# Altium footprint library 22-Transformer.PcbLib: 68 footprints (part 3 of 5)
Each footprint in its own frame and in the unit in brackets; x right, y up, seen from the top. Pads: shape width x height; smd on the part's side, far side on the other; paste and mask are expansions set on the pad; w line width, h text height; cw(c..) or ccw(c..) is an arc to the next point about the centre after c.
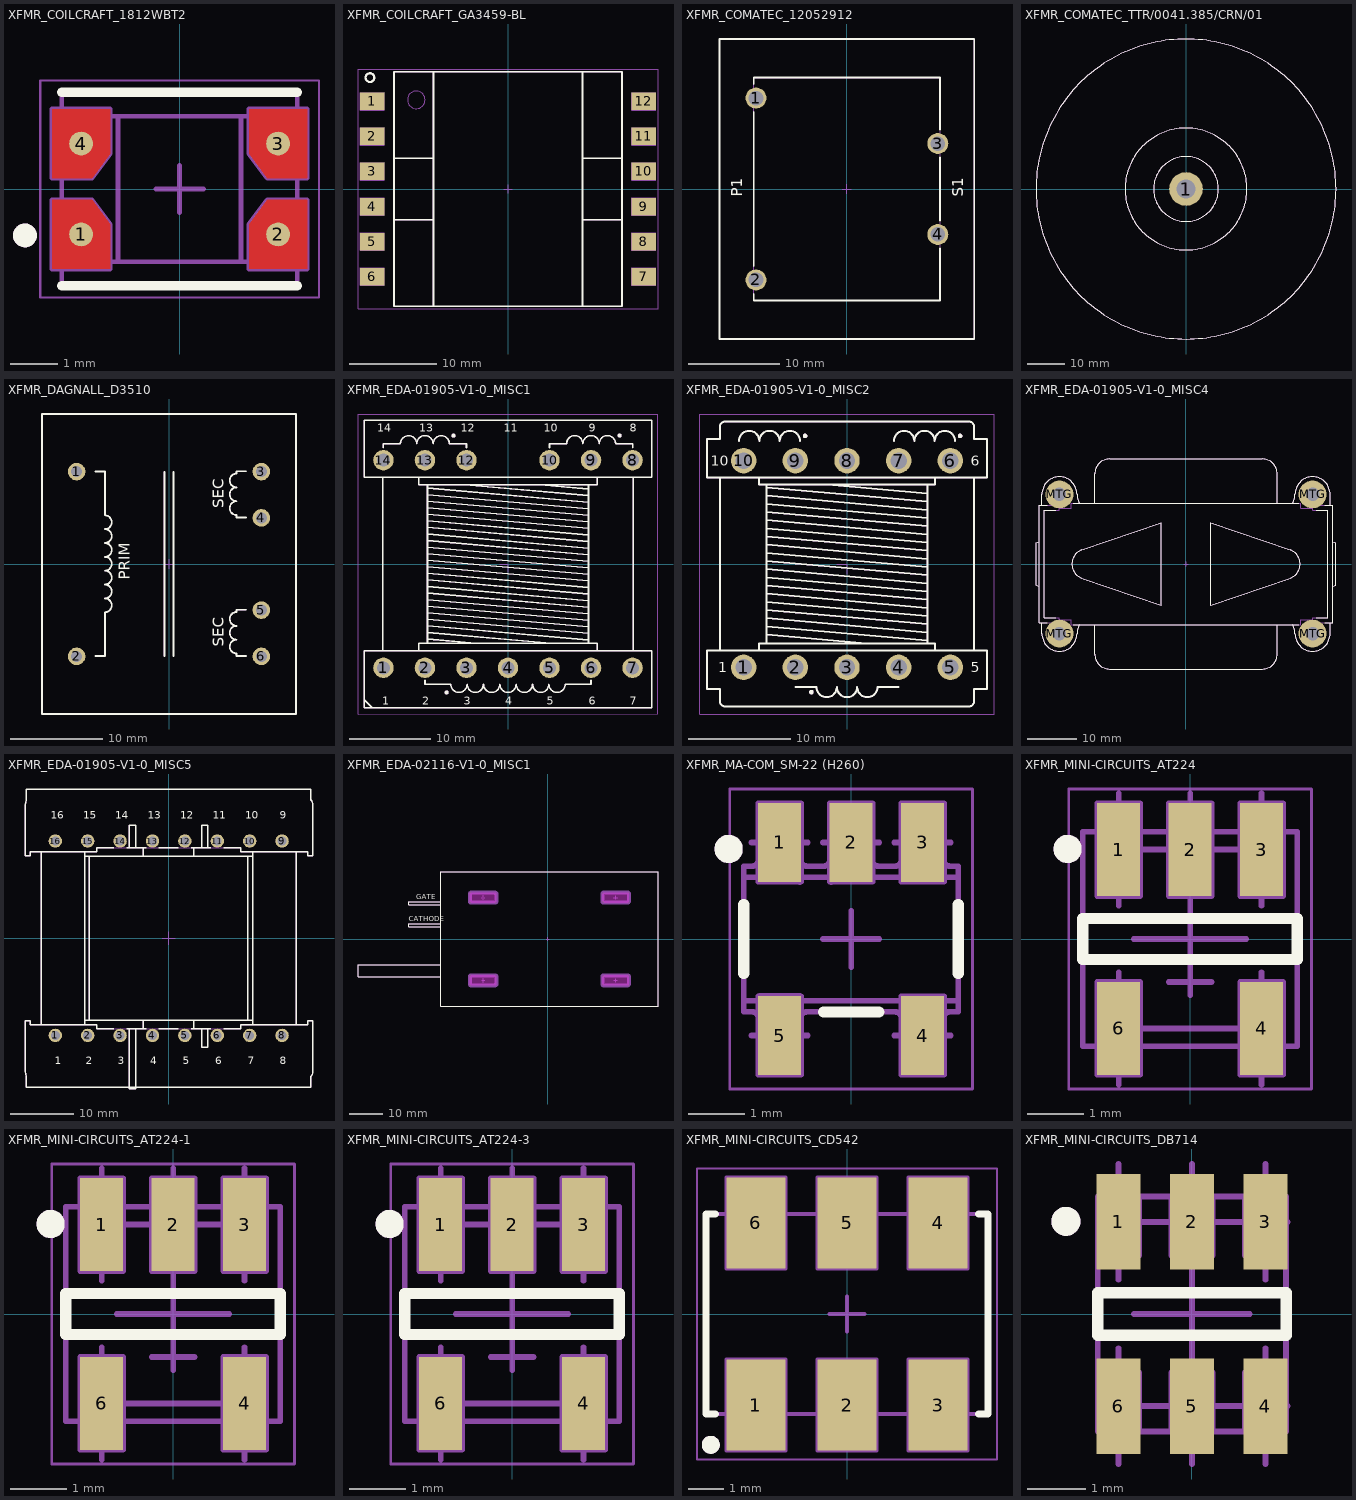
[diagram p2: the footprints below, top view; thin cyan lines are the x and y axes]

## XFMR_COILCRAFT_1812WBT2 [mm] "Surface Mount Wideband RF Transformer, Body 4.95 x 3.81mm"
height 3.43
pads (4):
  round 0.5 smd paste-0.26 mask-0.26: 1(-2.07,-0.955) 2(2.07,-0.955) 3(2.07,0.955) 4(-2.07,0.955)
Top Layer:
  region: -2.68,1.68 -1.46,1.68 -1.46,0.74 -1.84,0.23 -2.68,0.23
  region: -2.68,-1.68 -1.46,-1.68 -1.46,-0.74 -1.84,-0.23 -2.68,-0.23
  region: 2.68,-1.68 1.46,-1.68 1.46,-0.74 1.84,-0.23 2.68,-0.23
  region: 2.68,1.68 1.46,1.68 1.46,0.74 1.84,0.23 2.68,0.23
Top Overlay:
  circle w0.25: c-3.25,-0.975 r0.125
  lines w0.2: -2.475,-2.03 2.475,-2.03 ; -2.475,2.03 2.475,2.03
Mechanical 8:
  lines w0.1: -2.57,-0.955 -2.07,-0.955 ; -2.57,0.955 -2.07,0.955 ; -2.07,-1.455 -2.07,-0.955 ; -2.07,-0.455 -2.07,-0.955 ; -2.07,0.455 -2.07,0.955 ; -2.07,1.455 -2.07,0.955 ; -1.57,-0.955 -2.07,-0.955 ; -1.57,0.955 -2.07,0.955 ; -0.5,0 0,0 ; 0,-0.5 0,0 ; 0,0.5 0,0 ; 0.5,0 0,0 ; 1.57,-0.955 2.07,-0.955 ; 1.57,0.955 2.07,0.955 ; 2.07,-1.455 2.07,-0.955 ; 2.07,-0.455 2.07,-0.955 ; 2.07,0.455 2.07,0.955 ; 2.07,1.455 2.07,0.955 ; 2.57,-0.955 2.07,-0.955 ; 2.57,0.955 2.07,0.955 ; -2.68,-1.68 -2.68,-0.23 -1.84,-0.23 -1.46,-0.74 -1.46,-1.68 -2.68,-1.68 ; -2.68,0.23 -2.68,1.68 -1.46,1.68 -1.46,0.74 -1.84,0.23 -2.68,0.23 ; 1.46,-1.68 1.46,-0.74 1.84,-0.23 2.68,-0.23 2.68,-1.68 1.46,-1.68 ; 1.46,0.74 1.46,1.68 2.68,1.68 2.68,0.23 1.84,0.23 1.46,0.74
Mechanical 14:
  circle w0.25: c-3.25,-0.975 r0.125
  circle w0.1: c-1.95,-0.975 r0.3
  lines w0.1: -2.475,-1.53 2.475,-1.53 ; -2.475,1.53 2.475,1.53 ; -1.293,-1.53 -1.293,1.53 ; 1.293,-1.53 1.293,1.53 ; -2.475,-2.03 -2.475,2.03 2.475,2.03 2.475,-2.03 -2.475,-2.03
Mechanical 15:
  lines w0.05: -2.93,-2.28 -2.93,2.28 2.93,2.28 2.93,-2.28 -2.93,-2.28
3D body "XFMR_COILCRAFT_1812WBT2.stp": height 3.44, standoff 0, extent -2.475,-2.03 2.475,2.03

## XFMR_COILCRAFT_GA3459-BL [mm] "Flyback Transformer, Body 26 x 26.75mm"
height 14
pads (12):
  rect 2.75x2 smd: 1(-15.475,10) 2(-15.475,6) 3(-15.475,2) 4(-15.475,-2) 5(-15.475,-6) 6(-15.475,-10) 7(15.475,-10) 8(15.475,-6) 9(15.475,-2) 10(15.475,2) 11(15.475,6) 12(15.475,10)
Top Overlay:
  circle w0.25: c-15.74,12.7 r0.5
  lines w0.2: -13,-3.5 -8.5,-3.5 ; -13,3.5 -8.5,3.5 ; -8.5,-13.375 -8.5,13.375 ; 8.5,-13.375 8.5,13.375 ; 8.5,-3.5 13,-3.5 ; 8.5,3.5 13,3.5 ; -13,-13.375 13,-13.375 13,13.375 -13,13.375 -13,-13.375
Mechanical 8:
  lines w0.1: -15.975,-10 -15.475,-10 ; -15.975,-6 -15.475,-6 ; -15.975,-2 -15.475,-2 ; -15.975,2 -15.475,2 ; -15.975,6 -15.475,6 ; -15.975,10 -15.475,10 ; -15.475,-10.5 -15.475,-10 ; -15.475,-9.5 -15.475,-10 ; -15.475,-6.5 -15.475,-6 ; -15.475,-5.5 -15.475,-6 ; -15.475,-2.5 -15.475,-2 ; -15.475,-1.5 -15.475,-2 ; -15.475,1.5 -15.475,2 ; -15.475,2.5 -15.475,2 ; -15.475,5.5 -15.475,6 ; -15.475,6.5 -15.475,6 ; -15.475,9.5 -15.475,10 ; -15.475,10.5 -15.475,10 ; -14.975,-10 -15.475,-10 ; -14.975,-6 -15.475,-6 ; -14.975,-2 -15.475,-2 ; -14.975,2 -15.475,2 ; -14.975,6 -15.475,6 ; -14.975,10 -15.475,10 ; -0.5,0 0,0 ; 0,-0.5 0,0 ; 0,0.5 0,0 ; 0.5,0 0,0 ; 14.975,-10 15.475,-10 ; 14.975,-6 15.475,-6 ; 14.975,-2 15.475,-2 ; 14.975,2 15.475,2 ; 14.975,6 15.475,6 ; 14.975,10 15.475,10 ; 15.475,-10.5 15.475,-10 ; 15.475,-9.5 15.475,-10 ; 15.475,-6.5 15.475,-6 ; 15.475,-5.5 15.475,-6 ; 15.475,-2.5 15.475,-2 ; 15.475,-1.5 15.475,-2 ; 15.475,1.5 15.475,2 ; 15.475,2.5 15.475,2 ; 15.475,5.5 15.475,6 ; 15.475,6.5 15.475,6 ; 15.475,9.5 15.475,10 ; 15.475,10.5 15.475,10 ; 15.975,-10 15.475,-10 ; 15.975,-6 15.475,-6 ; 15.975,-2 15.475,-2 ; 15.975,2 15.475,2 ; 15.975,6 15.475,6 ; 15.975,10 15.475,10 ; -16.85,-11 -14.1,-11 -14.1,-9 -16.85,-9 -16.85,-11 ; -16.85,-7 -14.1,-7 -14.1,-5 -16.85,-5 -16.85,-7 ; -16.85,-3 -14.1,-3 -14.1,-1 -16.85,-1 -16.85,-3 ; -16.85,1 -14.1,1 -14.1,3 -16.85,3 -16.85,1 ; -16.85,5 -14.1,5 -14.1,7 -16.85,7 -16.85,5 ; -16.85,9 -14.1,9 -14.1,11 -16.85,11 -16.85,9 ; 14.1,-11 16.85,-11 16.85,-9 14.1,-9 14.1,-11 ; 14.1,-7 16.85,-7 16.85,-5 14.1,-5 14.1,-7 ; 14.1,-3 16.85,-3 16.85,-1 14.1,-1 14.1,-3 ; 14.1,1 16.85,1 16.85,3 14.1,3 14.1,1 ; 14.1,5 16.85,5 16.85,7 14.1,7 14.1,5 ; 14.1,9 16.85,9 16.85,11 14.1,11 14.1,9
Mechanical 14:
  circle w0.1: c-10.46,10.16 r1
  lines w0.1: -13,-3.5 -8.5,-3.5 ; -13,3.5 -8.5,3.5 ; -8.5,-13.375 -8.5,13.375 ; 8.5,-13.375 8.5,13.375 ; 8.5,-3.5 13,-3.5 ; 8.5,3.5 13,3.5 ; -13,-13.375 13,-13.375 13,13.375 -13,13.375 -13,-13.375
Mechanical 15:
  lines w0.05: -17.1,-13.625 -17.1,13.625 17.1,13.625 17.1,-13.625 -17.1,-13.625
3D body "XFMR_COILCRAFT_GA3459-BL.stp": height 14, standoff 0, extent -16.325,-13.375 16.325,13.375

## XFMR_COMATEC_12052912 [mm] "230VAC to 9.5VAC 2VA, Custom Transformer, Body 28mm x 33mm"
height 27
pads (4):
  round 2.3 hole 1.6: 1(-10,10) 2(-10,-10) 3(10,5) 4(10,-5)
Top Overlay:
  lines w0.2: -10.25,-11.53 -10.25,-12.25 10.25,-12.25 10.25,-6.53 ; -10.25,-8.47 -10.25,8.47 ; -10.25,11.53 -10.25,12.25 10.25,12.25 10.25,6.53 ; 10.25,-3.47 10.25,3.47 ; -14,-16.5 14,-16.5 14,16.5 -14,16.5 -14,-16.5
  text "S1" at 12.825,-0.85 h1.2
  text "P1" at -11.5,-0.875 h1.2
Mechanical 8:
  lines w0.1: -10.5,-10 -10,-10 ; -10.5,10 -10,10 ; -10,-10.5 -10,-10 ; -10,-9.5 -10,-10 ; -10,9.5 -10,10 ; -10,10.5 -10,10 ; -9.5,-10 -10,-10 ; -9.5,10 -10,10 ; -0.5,0 0,0 ; 0,-0.5 0,0 ; 0,0.5 0,0 ; 0.5,0 0,0 ; 9.5,-5 10,-5 ; 9.5,5 10,5 ; 10,-5.5 10,-5 ; 10,-4.5 10,-5 ; 10,4.5 10,5 ; 10,5.5 10,5 ; 10.5,-5 10,-5 ; 10.5,5 10,5
Mechanical 14:
  lines w0.1: -14,-16.5 14,-16.5 14,16.5 -14,16.5 -14,-16.5 ; -10.25,-12.25 -10.25,12.25 10.25,12.25 10.25,-12.25 -10.25,-12.25
  text "S1" at 12.825,-0.85 h1.2
  text "P1" at -11.5,-0.875 h1.2
3D body "XFMR_COMATEC_12052912.stp": height 27, standoff -3.6, extent -14,-16.5 14,16.5

## XFMR_COMATEC_TTR/0041.385/CRN/01 [mm] "230VAC to 15VAC and 15.5VAC and 8VAC, 41VA Toroidal Transformer"
height 36
pads (1):
  round 9 hole 5: 1(0,0)
Top Overlay:
  circle w0.2: c0,0 r16.253
  circle w0.2: c0,0 r8.653
  circle w0.2: c0,0 r40
Mechanical 8:
  lines w0.1: -0.5,0 0,0 ; 0,-0.5 0,0 ; 0,0.5 0,0 ; 0.5,0 0,0
Mechanical 14:
  circle w0.1: c0,0 r16.253
  circle w0.1: c0,0 r8.653
  circle w0.1: c0,0 r3
  circle w0.1: c0,0 r40
3D body "XFMR_COMATEC_TTR.0041.385.CRN.01.stp": height 45.9, standoff -4.1, extent -39.5,-39.5 39.5,39.5

## XFMR_DAGNALL_D3510 [mm] "DAGNALL 1VA PCB Mounted Encapsulated TransformerBody 27.5mm x 32.5mm"
height 21.3
pads (6):
  round 1.9 hole 1.2: 1(-10,10) 2(-10,-10) 3(10,10) 4(10,5) 5(10,-5) 6(10,-10)
Top Overlay:
  lines w0.2: -7.95,-9.975 -6.95,-9.975 -6.95,-5.225 ccw(c-6.95,-4.475) -6.95,-3.725 ccw(c-6.95,-2.975) -6.95,-2.225 ccw(c-6.95,-1.475) -6.95,-0.725 ccw(c-6.95,0.025) -6.95,0.775 ccw(c-6.95,1.525) -6.95,2.275 ccw(c-6.95,3.025) -6.95,3.775 ccw(c-6.95,4.525) -6.95,5.275 -6.95,10.025 -7.95,10.025 ; -0.5,-10 -0.5,10 ; 0.5,-10 0.5,10 ; 8.325,-9.95 7.325,-9.95 7.325,-9.7 cw(c7.325,-8.95) 7.325,-8.2 cw(c7.325,-7.45) 7.325,-6.7 cw(c7.325,-5.95) 7.325,-5.2 7.325,-4.95 8.325,-4.95 ; 8.325,5.05 7.325,5.05 7.325,5.3 cw(c7.325,6.05) 7.325,6.8 cw(c7.325,7.55) 7.325,8.3 cw(c7.325,9.05) 7.325,9.8 7.325,10.05 8.325,10.05 ; -13.75,-16.25 -13.75,16.25 13.75,16.25 13.75,-16.25 -13.75,-16.25
  text "SEC" at 5.925,-8.986 h1.2
  text "SEC" at 5.925,6.014 h1.2
  text "PRIM" at -4.264,-1.721 h1.2
Mechanical 8:
  lines w0.1: -10.5,-10 -10,-10 ; -10.5,10 -10,10 ; -10,-10.5 -10,-10 ; -10,-9.5 -10,-10 ; -10,9.5 -10,10 ; -10,10.5 -10,10 ; -9.5,-10 -10,-10 ; -9.5,10 -10,10 ; -0.5,0 0,0 ; 0,-0.5 0,0 ; 0,0.5 0,0 ; 0.5,0 0,0 ; 9.5,-10 10,-10 ; 9.5,-5 10,-5 ; 9.5,5 10,5 ; 9.5,10 10,10 ; 10,-10.5 10,-10 ; 10,-9.5 10,-10 ; 10,-5.5 10,-5 ; 10,-4.5 10,-5 ; 10,4.5 10,5 ; 10,5.5 10,5 ; 10,9.5 10,10 ; 10,10.5 10,10 ; 10.5,-10 10,-10 ; 10.5,-5 10,-5 ; 10.5,5 10,5 ; 10.5,10 10,10
Mechanical 14:
  lines w0.1: -7.95,-9.975 -6.95,-9.975 -6.95,-5.225 ccw(c-6.95,-4.475) -6.95,-3.725 ccw(c-6.95,-2.975) -6.95,-2.225 ccw(c-6.95,-1.475) -6.95,-0.725 ccw(c-6.95,0.025) -6.95,0.775 ccw(c-6.95,1.525) -6.95,2.275 ccw(c-6.95,3.025) -6.95,3.775 ccw(c-6.95,4.525) -6.95,5.275 -6.95,10.025 -7.95,10.025 ; -0.5,-10 -0.5,10 ; 0.5,-10 0.5,10 ; 8.325,-9.95 7.325,-9.95 7.325,-9.7 cw(c7.325,-8.95) 7.325,-8.2 cw(c7.325,-7.45) 7.325,-6.7 cw(c7.325,-5.95) 7.325,-5.2 7.325,-4.95 8.325,-4.95 ; 8.325,5.05 7.325,5.05 7.325,5.3 cw(c7.325,6.05) 7.325,6.8 cw(c7.325,7.55) 7.325,8.3 cw(c7.325,9.05) 7.325,9.8 7.325,10.05 8.325,10.05 ; -13.75,-16.25 -13.75,16.25 13.75,16.25 13.75,-16.25 -13.75,-16.25
  text "SEC" at 5.925,-8.986 h1.2
  text "SEC" at 5.925,6.014 h1.2
  text "PRIM" at -4.264,-1.721 h1.2
3D body "XFMR_DAGNALL_D3510.stp": height 21.3, standoff -3.6, extent -13.75,-16.25 13.75,16.25

## XFMR_EDA-01905-V1-0_MISC1 [mm] "ETD29 Core + Coil Former + Yoke"
height 25.4
pads (13):
  round 2.5 hole 1.6: 1(-15.24,-12.7) 2(-10.16,-12.7) 3(-5.08,-12.7) 4(0,-12.7) 5(5.08,-12.7) 6(10.16,-12.7) 7(15.24,-12.7) 8(15.24,12.7) 9(10.16,12.7) 10(5.08,12.7) 12(-5.08,12.7) 13(-10.16,12.7) 14(-15.24,12.7)
Top Overlay:
  circle w0.25: c-6.66,15.7 r0.125
  circle w0.25: c-7.5,-15.7 r0.125
  circle w0.25: c13.66,15.7 r0.125
  lines w0.2: -17.6,-16.6 -16.6,-17.6 ; -15.3,-10.6 -15.3,10.6 ; -15.24,14.2 -15.24,14.7 -13.16,14.7 cw(c-12.16,14.7) -11.16,14.7 cw(c-10.16,14.7) -9.16,14.7 cw(c-8.16,14.7) -7.16,14.7 -5.08,14.7 -5.08,14.2 ; -10.9,-10.6 -10.9,-9.7 10.9,-9.7 10.9,-10.6 ; -10.9,10.6 -10.9,9.7 10.9,9.7 10.9,10.6 ; -10.16,-14.2 -10.16,-14.7 -7,-14.7 ccw(c-6,-14.7) -5,-14.7 ccw(c-4,-14.7) -3,-14.7 ccw(c-2,-14.7) -1,-14.7 ccw(c0,-14.7) 1,-14.7 ccw(c2,-14.7) 3,-14.7 ccw(c4,-14.7) 5,-14.7 ccw(c6,-14.7) 7,-14.7 10.16,-14.7 10.16,-14.2 ; -9.848,-9.7 -9.848,9.7 ; -9.848,-9.177 -3.866,-9.7 ; -9.848,-8.374 5.313,-9.7 ; -9.848,-7.57 9.848,-9.294 ; -9.848,-6.767 9.848,-8.491 ; -9.848,-5.964 9.848,-7.688 ; -9.848,-5.161 9.848,-6.885 ; -9.848,-4.358 9.848,-6.081 ; -9.848,-3.555 9.848,-5.278 ; -9.848,-2.752 9.848,-4.475 ; -9.848,-1.949 9.848,-3.672 ; -9.848,-1.146 9.848,-2.869 ; -9.848,-0.343 9.848,-2.066 ; -9.848,0.46 9.848,-1.263 ; -9.848,1.263 9.848,-0.46 ; -9.848,2.066 9.848,0.343 ; -9.848,2.869 9.848,1.146 ; -9.848,3.672 9.848,1.949 ; -9.848,4.475 9.848,2.752 ; -9.848,5.278 9.848,3.555 ; -9.848,6.081 9.848,4.358 ; -9.848,6.885 9.848,5.161 ; -9.848,7.688 9.848,5.964 ; -9.848,8.491 9.848,6.767 ; -9.848,9.294 9.848,7.57 ; -5.313,9.7 9.848,8.374 ; 3.866,9.7 9.848,9.177 ; 5.08,14.2 5.08,14.7 7.16,14.7 cw(c8.16,14.7) 9.16,14.7 cw(c10.16,14.7) 11.16,14.7 cw(c12.16,14.7) 13.16,14.7 15.24,14.7 15.24,14.2 ; 9.848,-9.7 9.848,9.7 ; 15.3,-10.6 15.3,10.6 ; -17.6,-17.6 17.6,-17.6 17.6,-10.6 -17.6,-10.6 -17.6,-17.6 ; -17.6,10.6 -17.6,17.6 17.6,17.6 17.6,10.6 -17.6,10.6
  text "8" at 14.907,16.2 h1
  text "9" at 9.85,16.2 h1
  text "10" at 4.366,16.2 h1
  text "11" at -0.5,16.2 h1
  text "12" at -5.794,16.2 h1
  text "13" at -10.874,16.2 h1
  text "14" at -15.978,16.2 h1
  text "7" at 14.907,-17.2 h1
  text "6" at 9.85,-17.2 h1
  text "5" at 4.747,-17.2 h1
  text "4" at -0.357,-17.2 h1
  text "3" at -5.413,-17.2 h1
  text "2" at -10.493,-17.2 h1
  text "1" at -15.359,-17.2 h1
Mechanical 8:
  circle w0.1: c-15.24,-12.7 r0.8
  circle w0.1: c-10.16,-12.7 r0.8
  circle w0.1: c-5.08,-12.7 r0.8
  circle w0.1: c0,-12.7 r0.8
  circle w0.1: c5.08,-12.7 r0.8
  circle w0.1: c10.16,-12.7 r0.8
  circle w0.1: c15.24,-12.7 r0.8
  circle w0.1: c-15.24,12.7 r0.8
  circle w0.1: c-10.16,12.7 r0.8
  circle w0.1: c-5.08,12.7 r0.8
  circle w0.1: c5.08,12.7 r0.8
  circle w0.1: c10.16,12.7 r0.8
  circle w0.1: c15.24,12.7 r0.8
  lines w0.1: -16.24,-12.7 -15.24,-12.7 -15.24,-13.7 ; -16.24,12.7 -15.24,12.7 -15.24,11.7 ; -11.16,-12.7 -10.16,-12.7 -10.16,-13.7 ; -11.16,12.7 -10.16,12.7 -10.16,11.7 ; -6.08,-12.7 -5.08,-12.7 -5.08,-13.7 ; -6.08,12.7 -5.08,12.7 -5.08,11.7 ; -1,-12.7 0,-12.7 0,-13.7 ; -1,0 0,0 0,-1 ; 4.08,-12.7 5.08,-12.7 5.08,-13.7 ; 4.08,12.7 5.08,12.7 5.08,11.7 ; 9.16,-12.7 10.16,-12.7 10.16,-13.7 ; 9.16,12.7 10.16,12.7 10.16,11.7 ; 14.24,-12.7 15.24,-12.7 15.24,-13.7 ; 14.24,12.7 15.24,12.7 15.24,11.7
Mechanical 14:
  circle w0.25: c-6.66,15.7 r0.125
  circle w0.25: c-7.5,-15.7 r0.125
  circle w0.25: c13.66,15.7 r0.125
  lines w0.1: -17.6,-16.6 -16.6,-17.6 ; -15.3,-10.6 -15.3,10.6 ; -15.24,14.2 -15.24,14.7 -13.16,14.7 cw(c-12.16,14.7) -11.16,14.7 cw(c-10.16,14.7) -9.16,14.7 cw(c-8.16,14.7) -7.16,14.7 -5.08,14.7 -5.08,14.2 ; -10.9,-10.6 -10.9,-9.7 10.9,-9.7 10.9,-10.6 ; -10.9,10.6 -10.9,9.7 10.9,9.7 10.9,10.6 ; -10.16,-14.2 -10.16,-14.7 -7,-14.7 ccw(c-6,-14.7) -5,-14.7 ccw(c-4,-14.7) -3,-14.7 ccw(c-2,-14.7) -1,-14.7 ccw(c0,-14.7) 1,-14.7 ccw(c2,-14.7) 3,-14.7 ccw(c4,-14.7) 5,-14.7 ccw(c6,-14.7) 7,-14.7 10.16,-14.7 10.16,-14.2 ; -9.848,-9.7 -9.848,9.7 ; -9.848,-9.177 -3.866,-9.7 ; -9.848,-8.374 5.313,-9.7 ; -9.848,-7.57 9.848,-9.294 ; -9.848,-6.767 9.848,-8.491 ; -9.848,-5.964 9.848,-7.688 ; -9.848,-5.161 9.848,-6.885 ; -9.848,-4.358 9.848,-6.081 ; -9.848,-3.555 9.848,-5.278 ; -9.848,-2.752 9.848,-4.475 ; -9.848,-1.949 9.848,-3.672 ; -9.848,-1.146 9.848,-2.869 ; -9.848,-0.343 9.848,-2.066 ; -9.848,0.46 9.848,-1.263 ; -9.848,1.263 9.848,-0.46 ; -9.848,2.066 9.848,0.343 ; -9.848,2.869 9.848,1.146 ; -9.848,3.672 9.848,1.949 ; -9.848,4.475 9.848,2.752 ; -9.848,5.278 9.848,3.555 ; -9.848,6.081 9.848,4.358 ; -9.848,6.885 9.848,5.161 ; -9.848,7.688 9.848,5.964 ; -9.848,8.491 9.848,6.767 ; -9.848,9.294 9.848,7.57 ; -5.313,9.7 9.848,8.374 ; 3.866,9.7 9.848,9.177 ; 5.08,14.2 5.08,14.7 7.16,14.7 cw(c8.16,14.7) 9.16,14.7 cw(c10.16,14.7) 11.16,14.7 cw(c12.16,14.7) 13.16,14.7 15.24,14.7 15.24,14.2 ; 9.848,-9.7 9.848,9.7 ; 15.3,-10.6 15.3,10.6 ; -17.6,-17.6 17.6,-17.6 17.6,-10.6 -17.6,-10.6 -17.6,-17.6 ; -17.6,10.6 -17.6,17.6 17.6,17.6 17.6,10.6 -17.6,10.6
  text "8" at 14.907,16.2 h1
  text "9" at 9.85,16.2 h1
  text "10" at 4.366,16.2 h1
  text "11" at -0.5,16.2 h1
  text "12" at -5.794,16.2 h1
  text "13" at -10.874,16.2 h1
  text "14" at -15.978,16.2 h1
  text "7" at 14.907,-17.2 h1
  text "6" at 9.85,-17.2 h1
  text "5" at 4.747,-17.2 h1
  text "4" at -0.357,-17.2 h1
  text "3" at -5.413,-17.2 h1
  text "2" at -10.493,-17.2 h1
  text "1" at -15.359,-17.2 h1
Mechanical 15:
  lines w0.1: -18.35,-18.35 18.35,-18.35 18.35,18.35 -18.35,18.35 -18.35,-18.35
3D body "XFMR_EDA-01892-V1-0_misc1.stp": height 24.75, standoff -3.4, extent -17.6,-17.749 17.6,17.749

## XFMR_EDA-01905-V1-0_MISC2 [mm] "EF25 Core + Coil Former + Yoke"
height 20.7
pads (10):
  round 2.5 hole 1.6: 1(-10.16,-10.16) 2(-5.08,-10.16) 3(0,-10.16) 4(5.08,-10.16) 5(10.16,-10.16) 6(10.16,10.16) 7(5.08,10.16) 8(0,10.16) 9(-5.08,10.16) 10(-10.16,10.16)
Top Overlay:
  circle w0.2: c-4.12,12.595 r0.125
  circle w0.2: c11.12,12.595 r0.125
  circle w0.2: c-3.5,-12.595 r0.125
  lines w0.2: -12.5,-8.5 -12.5,8.5 ; -10.62,12.095 cw(c-9.62,12.095) -8.62,12.095 cw(c-7.62,12.095) -6.62,12.095 cw(c-5.62,12.095) -4.62,12.095 ; -8.65,-8.5 -8.65,-7.8 8.65,-7.8 8.65,-8.5 ; -8.65,8.5 -8.65,7.8 8.65,7.8 8.65,8.5 ; -7.9,-7.8 -7.9,7.8 ; -7.9,-6.938 1.954,-7.8 ; -7.9,-6.135 7.9,-7.517 ; -7.9,-5.332 7.9,-6.714 ; -7.9,-4.529 7.9,-5.911 ; -7.9,-3.726 7.9,-5.108 ; -7.9,-2.923 7.9,-4.305 ; -7.9,-2.12 7.9,-3.502 ; -7.9,-1.316 7.9,-2.699 ; -7.9,-0.513 7.9,-1.896 ; -7.9,0.29 7.9,-1.093 ; -7.9,1.093 7.9,-0.29 ; -7.9,1.896 7.9,0.513 ; -7.9,2.699 7.9,1.316 ; -7.9,3.502 7.9,2.12 ; -7.9,4.305 7.9,2.923 ; -7.9,5.108 7.9,3.726 ; -7.9,5.911 7.9,4.529 ; -7.9,6.714 7.9,5.332 ; -7.9,7.517 7.9,6.135 ; -5.08,-12.095 -3,-12.095 ccw(c-2,-12.095) -1,-12.095 ccw(c0,-12.095) 1,-12.095 ccw(c2,-12.095) 3,-12.095 5.08,-12.095 ; -1.954,7.8 7.9,6.938 ; 4.62,12.095 cw(c5.62,12.095) 6.62,12.095 cw(c7.62,12.095) 8.62,12.095 cw(c9.62,12.095) 10.62,12.095 ; 7.9,-7.8 7.9,7.8 ; 12.5,-8.5 12.5,8.5 ; -13.75,-12.3 -13.75,-8.5 13.75,-8.5 13.75,-12.3 12.5,-12.3 12.5,-13.5 cw(c12,-13.5) 12,-14 -12,-14 cw(c-12,-13.5) -12.5,-13.5 -12.5,-12.3 -13.75,-12.3 ; -13.75,8.5 -13.75,12.3 -12.5,12.3 -12.5,13.5 cw(c-12,13.5) -12,14 12,14 cw(c12,13.5) 12.5,13.5 12.5,12.3 13.75,12.3 13.75,8.5 -13.75,8.5
  text "10" at -13.41,9.66 h1
  text "6" at 12.16,9.66 h1
  text "5" at 12.16,-10.66 h1
  text "1" at -12.66,-10.66 h1
Mechanical 8:
  lines w0.1: -11.16,-10.16 -10.16,-10.16 -10.16,-11.16 ; -11.16,10.16 -10.16,10.16 -10.16,9.16 ; -6.08,-10.16 -5.08,-10.16 -5.08,-11.16 ; -6.08,10.16 -5.08,10.16 -5.08,9.16 ; -1,-10.16 0,-10.16 0,-11.16 ; -1,0 0,0 0,-1 ; -1,10.16 0,10.16 0,9.16 ; 4.08,-10.16 5.08,-10.16 5.08,-11.16 ; 4.08,10.16 5.08,10.16 5.08,9.16 ; 9.16,-10.16 10.16,-10.16 10.16,-11.16 ; 9.16,10.16 10.16,10.16 10.16,9.16 ; -10.51,-10.51 -10.51,-9.81 -9.81,-9.81 -9.81,-10.51 -10.51,-10.51 ; -10.51,9.81 -10.51,10.51 -9.81,10.51 -9.81,9.81 -10.51,9.81 ; -5.43,-10.51 -5.43,-9.81 -4.73,-9.81 -4.73,-10.51 -5.43,-10.51 ; -5.43,9.81 -5.43,10.51 -4.73,10.51 -4.73,9.81 -5.43,9.81 ; -0.35,-10.51 -0.35,-9.81 0.35,-9.81 0.35,-10.51 -0.35,-10.51 ; -0.35,9.81 -0.35,10.51 0.35,10.51 0.35,9.81 -0.35,9.81 ; 4.73,-10.51 4.73,-9.81 5.43,-9.81 5.43,-10.51 4.73,-10.51 ; 4.73,9.81 4.73,10.51 5.43,10.51 5.43,9.81 4.73,9.81 ; 9.81,-10.51 9.81,-9.81 10.51,-9.81 10.51,-10.51 9.81,-10.51 ; 9.81,9.81 9.81,10.51 10.51,10.51 10.51,9.81 9.81,9.81
Mechanical 14:
  circle w0.2: c-4.12,12.595 r0.125
  circle w0.2: c11.12,12.595 r0.125
  circle w0.2: c-3.5,-12.595 r0.125
  lines w0.1: -12.5,-8.5 -12.5,8.5 ; -10.62,12.095 cw(c-9.62,12.095) -8.62,12.095 cw(c-7.62,12.095) -6.62,12.095 cw(c-5.62,12.095) -4.62,12.095 ; -8.65,-8.5 -8.65,-7.8 8.65,-7.8 8.65,-8.5 ; -8.65,8.5 -8.65,7.8 8.65,7.8 8.65,8.5 ; -7.9,-7.8 -7.9,7.8 ; -7.9,-6.938 1.954,-7.8 ; -7.9,-6.135 7.9,-7.517 ; -7.9,-5.332 7.9,-6.714 ; -7.9,-4.529 7.9,-5.911 ; -7.9,-3.726 7.9,-5.108 ; -7.9,-2.923 7.9,-4.305 ; -7.9,-2.12 7.9,-3.502 ; -7.9,-1.316 7.9,-2.699 ; -7.9,-0.513 7.9,-1.896 ; -7.9,0.29 7.9,-1.093 ; -7.9,1.093 7.9,-0.29 ; -7.9,1.896 7.9,0.513 ; -7.9,2.699 7.9,1.316 ; -7.9,3.502 7.9,2.12 ; -7.9,4.305 7.9,2.923 ; -7.9,5.108 7.9,3.726 ; -7.9,5.911 7.9,4.529 ; -7.9,6.714 7.9,5.332 ; -7.9,7.517 7.9,6.135 ; -5.08,-12.095 -3,-12.095 ccw(c-2,-12.095) -1,-12.095 ccw(c0,-12.095) 1,-12.095 ccw(c2,-12.095) 3,-12.095 5.08,-12.095 ; -1.954,7.8 7.9,6.938 ; 4.62,12.095 cw(c5.62,12.095) 6.62,12.095 cw(c7.62,12.095) 8.62,12.095 cw(c9.62,12.095) 10.62,12.095 ; 7.9,-7.8 7.9,7.8 ; 12.5,-8.5 12.5,8.5 ; -13.75,-12.3 -13.75,-8.5 13.75,-8.5 13.75,-12.3 12.5,-12.3 12.5,-13.5 cw(c12,-13.5) 12,-14 -12,-14 cw(c-12,-13.5) -12.5,-13.5 -12.5,-12.3 -13.75,-12.3 ; -13.75,8.5 -13.75,12.3 -12.5,12.3 -12.5,13.5 cw(c-12,13.5) -12,14 12,14 cw(c12,13.5) 12.5,13.5 12.5,12.3 13.75,12.3 13.75,8.5 -13.75,8.5
  text "10" at -13.41,9.66 h1
  text "6" at 12.16,9.66 h1
  text "5" at 12.16,-10.66 h1
  text "1" at -12.66,-10.66 h1
Mechanical 15:
  lines w0.1: -14.5,-14.75 -14.5,14.75 14.5,14.75 14.5,-14.75 -14.5,-14.75
3D body "XFMR_EDA-01905-V1-0_misc2.stp": height 20.7, standoff -3.5, extent -13.75,-14 13.75,14
